# Altium schematic symbol library jlcpcb_2025_04_capacitors_extended_0805.schlib: 3281 symbols (part 11 of 18)
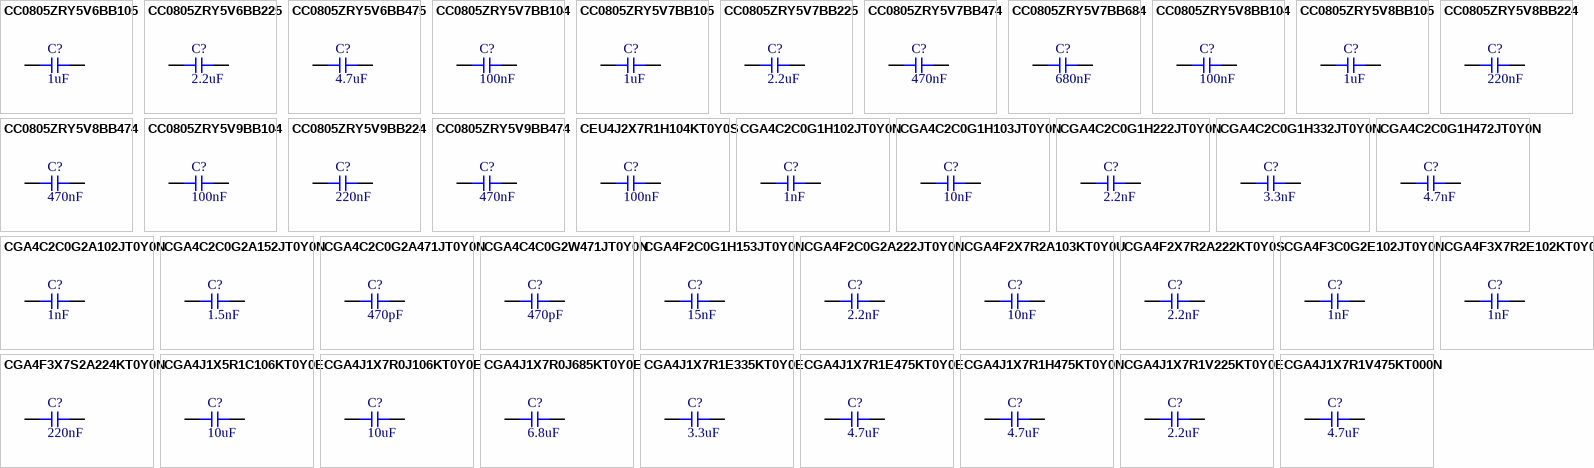
[diagram p92: symbols CC0805ZRY5V6BB105 to CGA4J1X7R1V475KT000N]

## CC0805ZRY5V8BB224
designator C?  Capacitance: 220nF  (hidden comment: *)
Capacitor, Ceramic (MLCC), 220nF, 25V, Y5V, SMD 0805; Manufacturer: YAGEO; Manufacturer Part Number: CC0805ZRY5V8BB224; Temperature Rating: -20%~+80%; Package Size: 0805; JLCPCB Basic Part: No; JLCPCB Part Number: C327192; Supplier 1: LCSC; Category: Capacitors - MLCC; Supplier Part Number 1: C327192; Voltage Rating: 25V; Temperature Coefficient: Y5V; RoHS: Yes; ComponentLink1Description: Datasheet; ComponentLink1URL: https://wmsc.lcsc.com/wmsc/upload/file/pdf/v2/lcsc/2006121004_YAGEO-CC0805ZRY5V8BB224_C327192.pdf; ComponentLink2Description: JLCPCB Part URL; ComponentLink2URL: https://jlcpcb.com/partdetail/C327192; ComponentLink3Description: LCSC Part URL; ComponentLink3URL: https://lcsc.com/product-detail/Multilayer-Ceramic-Capacitors-MLCC---SMD-SMT_YAGEO-YAGEO-CC0805ZRY5V8BB224_C327192.html
footprint CAP-0805 (0805 (2012M) Capacitor)
pins: 1, 2

## CC0805ZRY5V8BB474
designator C?  Capacitance: 470nF  (hidden comment: *)
Capacitor, Ceramic (MLCC), 470nF, 25V, Y5V, SMD 0805; Manufacturer: YAGEO; Manufacturer Part Number: CC0805ZRY5V8BB474; Temperature Rating: -20%~+80%; Package Size: 0805; JLCPCB Basic Part: No; JLCPCB Part Number: C327161; Supplier 1: LCSC; Category: Capacitors - MLCC; Supplier Part Number 1: C327161; Voltage Rating: 25V; Temperature Coefficient: Y5V; RoHS: Yes; ComponentLink1Description: Datasheet; ComponentLink1URL: https://wmsc.lcsc.com/wmsc/upload/file/pdf/v2/lcsc/1811141225_YAGEO-CC0805ZRY5V8BB474_C327161.pdf; ComponentLink2Description: JLCPCB Part URL; ComponentLink2URL: https://jlcpcb.com/partdetail/C327161; ComponentLink3Description: LCSC Part URL; ComponentLink3URL: https://lcsc.com/product-detail/Multilayer-Ceramic-Capacitors-MLCC---SMD-SMT_YAGEO-YAGEO-CC0805ZRY5V8BB474_C327161.html
footprint CAP-0805 (0805 (2012M) Capacitor)
pins: 1, 2

## CC0805ZRY5V9BB104
designator C?  Capacitance: 100nF  (hidden comment: *)
Capacitor, Ceramic (MLCC), 100nF, 50V, Y5V, SMD 0805; Manufacturer: YAGEO; Manufacturer Part Number: CC0805ZRY5V9BB104; Temperature Rating: -20%~+80%; Package Size: 0805; JLCPCB Basic Part: No; JLCPCB Part Number: C111496; Supplier 1: LCSC; Category: Capacitors - MLCC; Supplier Part Number 1: C111496; Voltage Rating: 50V; Temperature Coefficient: Y5V; RoHS: Yes; ComponentLink1Description: Datasheet; ComponentLink1URL: https://wmsc.lcsc.com/wmsc/upload/file/pdf/v2/lcsc/1811061415_YAGEO-CC0805ZRY5V9BB104_C111496.pdf; ComponentLink2Description: JLCPCB Part URL; ComponentLink2URL: https://jlcpcb.com/partdetail/C111496; ComponentLink3Description: LCSC Part URL; ComponentLink3URL: https://lcsc.com/product-detail/Multilayer-Ceramic-Capacitors-MLCC---SMD-SMT_YAGEO-YAGEO-CC0805ZRY5V9BB104_C111496.html
footprint CAP-0805 (0805 (2012M) Capacitor)
pins: 1, 2

## CC0805ZRY5V9BB224
designator C?  Capacitance: 220nF  (hidden comment: *)
Capacitor, Ceramic (MLCC), 220nF, 50V, Y5V, SMD 0805; Manufacturer: YAGEO; Manufacturer Part Number: CC0805ZRY5V9BB224; Temperature Rating: -20%~+80%; Package Size: 0805; JLCPCB Basic Part: No; JLCPCB Part Number: C326805; Supplier 1: LCSC; Category: Capacitors - MLCC; Supplier Part Number 1: C326805; Voltage Rating: 50V; Temperature Coefficient: Y5V; RoHS: Yes; ComponentLink1Description: Datasheet; ComponentLink1URL: https://wmsc.lcsc.com/wmsc/upload/file/pdf/v2/lcsc/1811141233_YAGEO-CC0805ZRY5V9BB224_C326805.pdf; ComponentLink2Description: JLCPCB Part URL; ComponentLink2URL: https://jlcpcb.com/partdetail/C326805; ComponentLink3Description: LCSC Part URL; ComponentLink3URL: https://lcsc.com/product-detail/Multilayer-Ceramic-Capacitors-MLCC---SMD-SMT_YAGEO-YAGEO-CC0805ZRY5V9BB224_C326805.html
footprint CAP-0805 (0805 (2012M) Capacitor)
pins: 1, 2

## CC0805ZRY5V9BB474
designator C?  Capacitance: 470nF  (hidden comment: *)
Capacitor, Ceramic (MLCC), 470nF, 50V, Y5V, SMD 0805; Manufacturer: YAGEO; Manufacturer Part Number: CC0805ZRY5V9BB474; Temperature Rating: -20%~+80%; Package Size: 0805; JLCPCB Basic Part: No; JLCPCB Part Number: C327107; Supplier 1: LCSC; Category: Capacitors - MLCC; Supplier Part Number 1: C327107; Voltage Rating: 50V; Temperature Coefficient: Y5V; RoHS: Yes; ComponentLink1Description: Datasheet; ComponentLink1URL: https://wmsc.lcsc.com/wmsc/upload/file/pdf/v2/lcsc/1811141233_YAGEO-CC0805ZRY5V9BB474_C327107.pdf; ComponentLink2Description: JLCPCB Part URL; ComponentLink2URL: https://jlcpcb.com/partdetail/C327107; ComponentLink3Description: LCSC Part URL; ComponentLink3URL: https://lcsc.com/product-detail/Multilayer-Ceramic-Capacitors-MLCC---SMD-SMT_YAGEO-YAGEO-CC0805ZRY5V9BB474_C327107.html
footprint CAP-0805 (0805 (2012M) Capacitor)
pins: 1, 2

## CEU4J2X7R1H104KT0Y0S
designator C?  Capacitance: 100nF  (hidden comment: *)
Capacitor, Ceramic (MLCC), 100nF, ±10%, 50V, X7R, ±10%, SMD 0805; Manufacturer: TDK; Manufacturer Part Number: CEU4J2X7R1H104KT0Y0S; Package Size: 0805; JLCPCB Basic Part: No; JLCPCB Part Number: C695378; Supplier 1: LCSC; Category: Capacitors - MLCC; Supplier Part Number 1: C695378; Tolerance: ±10%; Voltage Rating: 50V; Temperature Coefficient: X7R; RoHS: Yes; ComponentLink1Description: Datasheet; ComponentLink1URL: https://wmsc.lcsc.com/wmsc/upload/file/pdf/v2/lcsc/2009151538_TDK-CEU4J2X7R1H104KT0Y0S_C695378.pdf; ComponentLink2Description: JLCPCB Part URL; ComponentLink2URL: https://jlcpcb.com/partdetail/C695378; ComponentLink3Description: LCSC Part URL; ComponentLink3URL: https://lcsc.com/product-detail/Multilayer-Ceramic-Capacitors-MLCC---SMD-SMT_TDK-TDK-CEU4J2X7R1H104KT0Y0S_C695378.html
footprint CAP-0805 (0805 (2012M) Capacitor)
pins: 1, 2

## CGA4C2C0G1H102JT0Y0N
designator C?  Capacitance: 1nF  (hidden comment: *)
Capacitor, Ceramic (MLCC), 1nF, ±5%, 50V, C0G, ±5%, SMD 0805; Manufacturer: TDK; Manufacturer Part Number: CGA4C2C0G1H102JT0Y0N; Package Size: 0805; JLCPCB Basic Part: No; JLCPCB Part Number: C165822; Supplier 1: LCSC; Category: Capacitors - MLCC; Supplier Part Number 1: C165822; Tolerance: ±5%; Voltage Rating: 50V; Temperature Coefficient: C0G; RoHS: Yes; ComponentLink1Description: Datasheet; ComponentLink1URL: https://wmsc.lcsc.com/wmsc/upload/file/pdf/v2/lcsc/2304140030_TDK-CGA4C2C0G1H102JT0Y0N_C165822.pdf; ComponentLink2Description: JLCPCB Part URL; ComponentLink2URL: https://jlcpcb.com/partdetail/C165822; ComponentLink3Description: LCSC Part URL; ComponentLink3URL: https://lcsc.com/product-detail/Multilayer-Ceramic-Capacitors-MLCC---SMD-SMT_TDK-TDK-CGA4C2C0G1H102JT0Y0N_C165822.html
footprint CAP-0805 (0805 (2012M) Capacitor)
pins: 1, 2

## CGA4C2C0G1H103JT0Y0N
designator C?  Capacitance: 10nF  (hidden comment: *)
Capacitor, Ceramic (MLCC), 10nF, ±5%, 50V, C0G, ±5%, SMD 0805; Manufacturer: TDK; Manufacturer Part Number: CGA4C2C0G1H103JT0Y0N; Package Size: 0805; JLCPCB Basic Part: No; JLCPCB Part Number: C342877; Supplier 1: LCSC; Category: Capacitors - MLCC; Supplier Part Number 1: C342877; Tolerance: ±5%; Voltage Rating: 50V; Temperature Coefficient: C0G; RoHS: Yes; ComponentLink1Description: Datasheet; ComponentLink1URL: https://wmsc.lcsc.com/wmsc/upload/file/pdf/v2/lcsc/2304140030_TDK-CGA4C2C0G1H103JT0Y0N_C342877.pdf; ComponentLink2Description: JLCPCB Part URL; ComponentLink2URL: https://jlcpcb.com/partdetail/C342877; ComponentLink3Description: LCSC Part URL; ComponentLink3URL: https://lcsc.com/product-detail/Multilayer-Ceramic-Capacitors-MLCC---SMD-SMT_TDK-TDK-CGA4C2C0G1H103JT0Y0N_C342877.html
footprint CAP-0805 (0805 (2012M) Capacitor)
pins: 1, 2

## CGA4C2C0G1H222JT0Y0N
designator C?  Capacitance: 2.2nF  (hidden comment: *)
Capacitor, Ceramic (MLCC), 2.2nF, ±5%, 50V, C0G, ±5%, SMD 0805; Manufacturer: TDK; Manufacturer Part Number: CGA4C2C0G1H222JT0Y0N; Package Size: 0805; JLCPCB Basic Part: No; JLCPCB Part Number: C338118; Supplier 1: LCSC; Category: Capacitors - MLCC; Supplier Part Number 1: C338118; Tolerance: ±5%; Voltage Rating: 50V; Temperature Coefficient: C0G; RoHS: Yes; ComponentLink1Description: Datasheet; ComponentLink1URL: https://wmsc.lcsc.com/wmsc/upload/file/pdf/v2/lcsc/2304140030_TDK-CGA4C2C0G1H222JT0Y0N_C338118.pdf; ComponentLink2Description: JLCPCB Part URL; ComponentLink2URL: https://jlcpcb.com/partdetail/C338118; ComponentLink3Description: LCSC Part URL; ComponentLink3URL: https://lcsc.com/product-detail/Multilayer-Ceramic-Capacitors-MLCC---SMD-SMT_TDK-TDK-CGA4C2C0G1H222JT0Y0N_C338118.html
footprint CAP-0805 (0805 (2012M) Capacitor)
pins: 1, 2

## CGA4C2C0G1H332JT0Y0N
designator C?  Capacitance: 3.3nF  (hidden comment: *)
Capacitor, Ceramic (MLCC), 3.3nF, ±5%, 50V, C0G, ±5%, SMD 0805; Manufacturer: TDK; Manufacturer Part Number: CGA4C2C0G1H332JT0Y0N; Package Size: 0805; JLCPCB Basic Part: No; JLCPCB Part Number: C415302; Supplier 1: LCSC; Category: Capacitors - MLCC; Supplier Part Number 1: C415302; Tolerance: ±5%; Voltage Rating: 50V; Temperature Coefficient: C0G; RoHS: Yes; ComponentLink1Description: Datasheet; ComponentLink1URL: https://wmsc.lcsc.com/wmsc/upload/file/pdf/v2/lcsc/2304140030_TDK-CGA4C2C0G1H332JT0Y0N_C415302.pdf; ComponentLink2Description: JLCPCB Part URL; ComponentLink2URL: https://jlcpcb.com/partdetail/C415302; ComponentLink3Description: LCSC Part URL; ComponentLink3URL: https://lcsc.com/product-detail/Multilayer-Ceramic-Capacitors-MLCC---SMD-SMT_TDK-TDK-CGA4C2C0G1H332JT0Y0N_C415302.html
footprint CAP-0805 (0805 (2012M) Capacitor)
pins: 1, 2

## CGA4C2C0G1H472JT0Y0N
designator C?  Capacitance: 4.7nF  (hidden comment: *)
Capacitor, Ceramic (MLCC), 4.7nF, ±5%, 50V, C0G, ±5%, SMD 0805; Manufacturer: TDK; Manufacturer Part Number: CGA4C2C0G1H472JT0Y0N; Package Size: 0805; JLCPCB Basic Part: No; JLCPCB Part Number: C338091; Supplier 1: LCSC; Category: Capacitors - MLCC; Supplier Part Number 1: C338091; Tolerance: ±5%; Voltage Rating: 50V; Temperature Coefficient: C0G; RoHS: Yes; ComponentLink1Description: Datasheet; ComponentLink1URL: https://wmsc.lcsc.com/wmsc/upload/file/pdf/v2/lcsc/2304140030_TDK-CGA4C2C0G1H472JT0Y0N_C338091.pdf; ComponentLink2Description: JLCPCB Part URL; ComponentLink2URL: https://jlcpcb.com/partdetail/C338091; ComponentLink3Description: LCSC Part URL; ComponentLink3URL: https://lcsc.com/product-detail/Multilayer-Ceramic-Capacitors-MLCC---SMD-SMT_TDK-TDK-CGA4C2C0G1H472JT0Y0N_C338091.html
footprint CAP-0805 (0805 (2012M) Capacitor)
pins: 1, 2

## CGA4C2C0G2A102JT0Y0N
designator C?  Capacitance: 1nF  (hidden comment: *)
Capacitor, Ceramic (MLCC), 1nF, ±5%, 100V, C0G, ±5%, SMD 0805; Manufacturer: TDK; Manufacturer Part Number: CGA4C2C0G2A102JT0Y0N; Package Size: 0805; JLCPCB Basic Part: No; JLCPCB Part Number: C342977; Supplier 1: LCSC; Category: Capacitors - MLCC; Supplier Part Number 1: C342977; Tolerance: ±5%; Voltage Rating: 100V; Temperature Coefficient: C0G; RoHS: Yes; ComponentLink1Description: Datasheet; ComponentLink1URL: https://wmsc.lcsc.com/wmsc/upload/file/pdf/v2/lcsc/2304140030_TDK-CGA4C2C0G2A102JT0Y0N_C342977.pdf; ComponentLink2Description: JLCPCB Part URL; ComponentLink2URL: https://jlcpcb.com/partdetail/C342977; ComponentLink3Description: LCSC Part URL; ComponentLink3URL: https://lcsc.com/product-detail/Multilayer-Ceramic-Capacitors-MLCC---SMD-SMT_TDK-TDK-CGA4C2C0G2A102JT0Y0N_C342977.html
footprint CAP-0805 (0805 (2012M) Capacitor)
pins: 1, 2

## CGA4C2C0G2A152JT0Y0N
designator C?  Capacitance: 1.5nF  (hidden comment: *)
Capacitor, Ceramic (MLCC), 1.5nF, ±5%, 100V, C0G, ±5%, SMD 0805; Manufacturer: TDK; Manufacturer Part Number: CGA4C2C0G2A152JT0Y0N; Package Size: 0805; JLCPCB Basic Part: No; JLCPCB Part Number: C338059; Supplier 1: LCSC; Category: Capacitors - MLCC; Supplier Part Number 1: C338059; Tolerance: ±5%; Voltage Rating: 100V; Temperature Coefficient: C0G; RoHS: Yes; ComponentLink1Description: Datasheet; ComponentLink1URL: https://wmsc.lcsc.com/wmsc/upload/file/pdf/v2/lcsc/2304140030_TDK-CGA4C2C0G2A152JT0Y0N_C338059.pdf; ComponentLink2Description: JLCPCB Part URL; ComponentLink2URL: https://jlcpcb.com/partdetail/C338059; ComponentLink3Description: LCSC Part URL; ComponentLink3URL: https://lcsc.com/product-detail/Multilayer-Ceramic-Capacitors-MLCC---SMD-SMT_TDK-TDK-CGA4C2C0G2A152JT0Y0N_C338059.html
footprint CAP-0805 (0805 (2012M) Capacitor)
pins: 1, 2

## CGA4C2C0G2A471JT0Y0N
designator C?  Capacitance: 470pF  (hidden comment: *)
Capacitor, Ceramic (MLCC), 470pF, ±5%, 100V, C0G, ±5%, SMD 0805; Manufacturer: TDK; Manufacturer Part Number: CGA4C2C0G2A471JT0Y0N; Package Size: 0805; JLCPCB Basic Part: No; JLCPCB Part Number: C694228; Supplier 1: LCSC; Category: Capacitors - MLCC; Supplier Part Number 1: C694228; Tolerance: ±5%; Voltage Rating: 100V; Temperature Coefficient: C0G; RoHS: Yes; ComponentLink1Description: Datasheet; ComponentLink1URL: https://wmsc.lcsc.com/wmsc/upload/file/pdf/v2/lcsc/2304140030_TDK-CGA4C2C0G2A471JT0Y0N_C694228.pdf; ComponentLink2Description: JLCPCB Part URL; ComponentLink2URL: https://jlcpcb.com/partdetail/C694228; ComponentLink3Description: LCSC Part URL; ComponentLink3URL: https://lcsc.com/product-detail/Multilayer-Ceramic-Capacitors-MLCC---SMD-SMT_TDK-TDK-CGA4C2C0G2A471JT0Y0N_C694228.html
footprint CAP-0805 (0805 (2012M) Capacitor)
pins: 1, 2

## CGA4C4C0G2W471JT0Y0N
designator C?  Capacitance: 470pF  (hidden comment: *)
Capacitor, Ceramic (MLCC), 470pF, ±5%, 450V, C0G, ±5%, SMD 0805; Manufacturer: TDK; Manufacturer Part Number: CGA4C4C0G2W471JT0Y0N; Package Size: 0805; JLCPCB Basic Part: No; JLCPCB Part Number: C694507; Supplier 1: LCSC; Category: Capacitors - MLCC; Supplier Part Number 1: C694507; Tolerance: ±5%; Voltage Rating: 450V; Temperature Coefficient: C0G; RoHS: Yes; ComponentLink1Description: Datasheet; ComponentLink1URL: https://wmsc.lcsc.com/wmsc/upload/file/pdf/v2/lcsc/2304140030_TDK-CGA4C4C0G2W471JT0Y0N_C694507.pdf; ComponentLink2Description: JLCPCB Part URL; ComponentLink2URL: https://jlcpcb.com/partdetail/C694507; ComponentLink3Description: LCSC Part URL; ComponentLink3URL: https://lcsc.com/product-detail/Multilayer-Ceramic-Capacitors-MLCC---SMD-SMT_TDK-TDK-CGA4C4C0G2W471JT0Y0N_C694507.html
footprint CAP-0805 (0805 (2012M) Capacitor)
pins: 1, 2

## CGA4F2C0G1H153JT0Y0N
designator C?  Capacitance: 15nF  (hidden comment: *)
Capacitor, Ceramic (MLCC), 15nF, ±5%, 50V, C0G, ±5%, SMD 0805; Manufacturer: TDK; Manufacturer Part Number: CGA4F2C0G1H153JT0Y0N; Package Size: 0805; JLCPCB Basic Part: No; JLCPCB Part Number: C384557; Supplier 1: LCSC; Category: Capacitors - MLCC; Supplier Part Number 1: C384557; Tolerance: ±5%; Voltage Rating: 50V; Temperature Coefficient: C0G; RoHS: Yes; ComponentLink1Description: Datasheet; ComponentLink2Description: JLCPCB Part URL; ComponentLink2URL: https://jlcpcb.com/partdetail/C384557; ComponentLink3Description: LCSC Part URL; ComponentLink3URL: https://lcsc.com/product-detail/Multilayer-Ceramic-Capacitors-MLCC---SMD-SMT_TDK-TDK-CGA4F2C0G1H153JT0Y0N_C384557.html
footprint CAP-0805 (0805 (2012M) Capacitor)
pins: 1, 2

## CGA4F2C0G2A222JT0Y0N
designator C?  Capacitance: 2.2nF  (hidden comment: *)
Capacitor, Ceramic (MLCC), 2.2nF, ±5%, 100V, C0G, ±5%, SMD 0805; Manufacturer: TDK; Manufacturer Part Number: CGA4F2C0G2A222JT0Y0N; Package Size: 0805; JLCPCB Basic Part: No; JLCPCB Part Number: C694508; Supplier 1: LCSC; Category: Capacitors - MLCC; Supplier Part Number 1: C694508; Tolerance: ±5%; Voltage Rating: 100V; Temperature Coefficient: C0G; RoHS: Yes; ComponentLink1Description: Datasheet; ComponentLink1URL: https://wmsc.lcsc.com/wmsc/upload/file/pdf/v2/lcsc/2304140030_TDK-CGA4F2C0G2A222JT0Y0N_C694508.pdf; ComponentLink2Description: JLCPCB Part URL; ComponentLink2URL: https://jlcpcb.com/partdetail/C694508; ComponentLink3Description: LCSC Part URL; ComponentLink3URL: https://lcsc.com/product-detail/Multilayer-Ceramic-Capacitors-MLCC---SMD-SMT_TDK-TDK-CGA4F2C0G2A222JT0Y0N_C694508.html
footprint CAP-0805 (0805 (2012M) Capacitor)
pins: 1, 2

## CGA4F2X7R2A103KT0Y0U
designator C?  Capacitance: 10nF  (hidden comment: *)
Capacitor, Ceramic (MLCC), 10nF, ±10%, 100V, X7R, ±10%, SMD 0805; Manufacturer: TDK; Manufacturer Part Number: CGA4F2X7R2A103KT0Y0U; Package Size: 0805; JLCPCB Basic Part: No; JLCPCB Part Number: C338048; Supplier 1: LCSC; Category: Capacitors - MLCC; Supplier Part Number 1: C338048; Tolerance: ±10%; Voltage Rating: 100V; Temperature Coefficient: X7R; RoHS: Yes; ComponentLink1Description: Datasheet; ComponentLink1URL: https://wmsc.lcsc.com/wmsc/upload/file/pdf/v2/lcsc/2304140030_TDK-CGA4F2X7R2A103KT0Y0U_C338048.pdf; ComponentLink2Description: JLCPCB Part URL; ComponentLink2URL: https://jlcpcb.com/partdetail/C338048; ComponentLink3Description: LCSC Part URL; ComponentLink3URL: https://lcsc.com/product-detail/Multilayer-Ceramic-Capacitors-MLCC---SMD-SMT_TDK-TDK-CGA4F2X7R2A103KT0Y0U_C338048.html
footprint CAP-0805 (0805 (2012M) Capacitor)
pins: 1, 2

## CGA4F2X7R2A222KT0Y0S
designator C?  Capacitance: 2.2nF  (hidden comment: *)
Capacitor, Ceramic (MLCC), 2.2nF, ±10%, 100V, X7R, ±10%, SMD 0805; Manufacturer: TDK; Manufacturer Part Number: CGA4F2X7R2A222KT0Y0S; Package Size: 0805; JLCPCB Basic Part: No; JLCPCB Part Number: C880704; Supplier 1: LCSC; Category: Capacitors - MLCC; Supplier Part Number 1: C880704; Tolerance: ±10%; Voltage Rating: 100V; Temperature Coefficient: X7R; RoHS: Yes; ComponentLink1Description: Datasheet; ComponentLink1URL: https://wmsc.lcsc.com/wmsc/upload/file/pdf/v2/lcsc/2304140030_TDK-CGA4F2X7R2A222KT0Y0S_C880704.pdf; ComponentLink2Description: JLCPCB Part URL; ComponentLink2URL: https://jlcpcb.com/partdetail/C880704; ComponentLink3Description: LCSC Part URL; ComponentLink3URL: https://lcsc.com/product-detail/Multilayer-Ceramic-Capacitors-MLCC---SMD-SMT_TDK-TDK-CGA4F2X7R2A222KT0Y0S_C880704.html
footprint CAP-0805 (0805 (2012M) Capacitor)
pins: 1, 2

## CGA4F3C0G2E102JT0Y0N
designator C?  Capacitance: 1nF  (hidden comment: *)
Capacitor, Ceramic (MLCC), 1nF, ±5%, 250V, C0G, ±5%, SMD 0805; Manufacturer: TDK; Manufacturer Part Number: CGA4F3C0G2E102JT0Y0N; Package Size: 0805; JLCPCB Basic Part: No; JLCPCB Part Number: C338119; Supplier 1: LCSC; Category: Capacitors - MLCC; Supplier Part Number 1: C338119; Tolerance: ±5%; Voltage Rating: 250V; Temperature Coefficient: C0G; RoHS: Yes; ComponentLink1Description: Datasheet; ComponentLink1URL: https://wmsc.lcsc.com/wmsc/upload/file/pdf/v2/lcsc/2304140030_TDK-CGA4F3C0G2E102JT0Y0N_C338119.pdf; ComponentLink2Description: JLCPCB Part URL; ComponentLink2URL: https://jlcpcb.com/partdetail/C338119; ComponentLink3Description: LCSC Part URL; ComponentLink3URL: https://lcsc.com/product-detail/Multilayer-Ceramic-Capacitors-MLCC---SMD-SMT_TDK-TDK-CGA4F3C0G2E102JT0Y0N_C338119.html
footprint CAP-0805 (0805 (2012M) Capacitor)
pins: 1, 2

## CGA4F3X7R2E102KT0Y0U
designator C?  Capacitance: 1nF  (hidden comment: *)
Capacitor, Ceramic (MLCC), 1nF, 250V, X7R, SMD 0805; Manufacturer: TDK; Manufacturer Part Number: CGA4F3X7R2E102KT0Y0U; Package Size: 0805; JLCPCB Basic Part: No; JLCPCB Part Number: C2802696; Supplier 1: LCSC; Category: Capacitors - MLCC; Supplier Part Number 1: C2802696; Voltage Rating: 250V; Temperature Coefficient: X7R; RoHS: Yes; ComponentLink1Description: Datasheet; ComponentLink1URL: https://wmsc.lcsc.com/wmsc/upload/file/pdf/v2/lcsc/2106031738_TDK-CGA4F3X7R2E102KT0Y0U_C2802696.pdf; ComponentLink2Description: JLCPCB Part URL; ComponentLink2URL: https://jlcpcb.com/partdetail/C2802696; ComponentLink3Description: LCSC Part URL; ComponentLink3URL: https://lcsc.com/product-detail/Multilayer-Ceramic-Capacitors-MLCC---SMD-SMT_TDK-TDK-CGA4F3X7R2E102KT0Y0U_C2802696.html
footprint CAP-0805 (0805 (2012M) Capacitor)
pins: 1, 2

## CGA4F3X7S2A224KT0Y0N
designator C?  Capacitance: 220nF  (hidden comment: *)
Capacitor, Ceramic (MLCC), 220nF, ±10%, 100V, X7S, ±10%, SMD 0805; Manufacturer: TDK; Manufacturer Part Number: CGA4F3X7S2A224KT0Y0N; Package Size: 0805; JLCPCB Basic Part: No; JLCPCB Part Number: C338099; Supplier 1: LCSC; Category: Capacitors - MLCC; Supplier Part Number 1: C338099; Tolerance: ±10%; Voltage Rating: 100V; Temperature Coefficient: X7S; RoHS: Yes; ComponentLink1Description: Datasheet; ComponentLink1URL: https://wmsc.lcsc.com/wmsc/upload/file/pdf/v2/lcsc/2304140030_TDK-CGA4F3X7S2A224KT0Y0N_C338099.pdf; ComponentLink2Description: JLCPCB Part URL; ComponentLink2URL: https://jlcpcb.com/partdetail/C338099; ComponentLink3Description: LCSC Part URL; ComponentLink3URL: https://lcsc.com/product-detail/Multilayer-Ceramic-Capacitors-MLCC---SMD-SMT_TDK-TDK-CGA4F3X7S2A224KT0Y0N_C338099.html
footprint CAP-0805 (0805 (2012M) Capacitor)
pins: 1, 2

## CGA4J1X5R1C106KT0Y0E
designator C?  Capacitance: 10uF  (hidden comment: *)
Capacitor, Ceramic (MLCC), 10uF, ±10%, 16V, X5R, ±10%, SMD 0805; Manufacturer: TDK; Manufacturer Part Number: CGA4J1X5R1C106KT0Y0E; Package Size: 0805; JLCPCB Basic Part: No; JLCPCB Part Number: C342712; Supplier 1: LCSC; Category: Capacitors - MLCC; Supplier Part Number 1: C342712; Tolerance: ±10%; Voltage Rating: 16V; Temperature Coefficient: X5R; RoHS: Yes; ComponentLink1Description: Datasheet; ComponentLink1URL: https://wmsc.lcsc.com/wmsc/upload/file/pdf/v2/lcsc/2304140030_TDK-CGA4J1X5R1C106KT0Y0E_C342712.pdf; ComponentLink2Description: JLCPCB Part URL; ComponentLink2URL: https://jlcpcb.com/partdetail/C342712; ComponentLink3Description: LCSC Part URL; ComponentLink3URL: https://lcsc.com/product-detail/Multilayer-Ceramic-Capacitors-MLCC---SMD-SMT_TDK-TDK-CGA4J1X5R1C106KT0Y0E_C342712.html
footprint CAP-0805 (0805 (2012M) Capacitor)
pins: 1, 2

## CGA4J1X7R0J106KT0Y0E
designator C?  Capacitance: 10uF  (hidden comment: *)
Capacitor, Ceramic (MLCC), 10uF, ±10%, 6.3V, X7R, ±10%, SMD 0805; Manufacturer: TDK; Manufacturer Part Number: CGA4J1X7R0J106KT0Y0E; Package Size: 0805; JLCPCB Basic Part: No; JLCPCB Part Number: C338061; Supplier 1: LCSC; Category: Capacitors - MLCC; Supplier Part Number 1: C338061; Tolerance: ±10%; Voltage Rating: 6.3V; Temperature Coefficient: X7R; RoHS: Yes; ComponentLink1Description: Datasheet; ComponentLink1URL: https://wmsc.lcsc.com/wmsc/upload/file/pdf/v2/lcsc/2304140030_TDK-CGA4J1X7R0J106KT0Y0E_C338061.pdf; ComponentLink2Description: JLCPCB Part URL; ComponentLink2URL: https://jlcpcb.com/partdetail/C338061; ComponentLink3Description: LCSC Part URL; ComponentLink3URL: https://lcsc.com/product-detail/Multilayer-Ceramic-Capacitors-MLCC---SMD-SMT_TDK-TDK-CGA4J1X7R0J106KT0Y0E_C338061.html
footprint CAP-0805 (0805 (2012M) Capacitor)
pins: 1, 2

## CGA4J1X7R0J685KT0Y0E
designator C?  Capacitance: 6.8uF  (hidden comment: *)
Capacitor, Ceramic (MLCC), 6.8uF, 6.3V, X7R, SMD 0805; Manufacturer: TDK; Manufacturer Part Number: CGA4J1X7R0J685KT0Y0E; Package Size: 0805; JLCPCB Basic Part: No; JLCPCB Part Number: C2680661; Supplier 1: LCSC; Category: Capacitors - MLCC; Supplier Part Number 1: C2680661; Voltage Rating: 6.3V; Temperature Coefficient: X7R; RoHS: Yes; ComponentLink1Description: Datasheet; ComponentLink1URL: https://wmsc.lcsc.com/wmsc/upload/file/pdf/v2/lcsc/2101051104_TDK-CGA4J1X7R0J685KT0Y0E_C2680661.pdf; ComponentLink2Description: JLCPCB Part URL; ComponentLink2URL: https://jlcpcb.com/partdetail/C2680661; ComponentLink3Description: LCSC Part URL; ComponentLink3URL: https://lcsc.com/product-detail/Multilayer-Ceramic-Capacitors-MLCC---SMD-SMT_TDK-TDK-CGA4J1X7R0J685KT0Y0E_C2680661.html
footprint CAP-0805 (0805 (2012M) Capacitor)
pins: 1, 2

## CGA4J1X7R1E335KT0Y0E
designator C?  Capacitance: 3.3uF  (hidden comment: *)
Capacitor, Ceramic (MLCC), 3.3uF, ±10%, 25V, X7R, ±10%, SMD 0805; Manufacturer: TDK; Manufacturer Part Number: CGA4J1X7R1E335KT0Y0E; Package Size: 0805; JLCPCB Basic Part: No; JLCPCB Part Number: C409449; Supplier 1: LCSC; Category: Capacitors - MLCC; Supplier Part Number 1: C409449; Tolerance: ±10%; Voltage Rating: 25V; Temperature Coefficient: X7R; RoHS: Yes; ComponentLink1Description: Datasheet; ComponentLink1URL: https://wmsc.lcsc.com/wmsc/upload/file/pdf/v2/lcsc/2304140030_TDK-CGA4J1X7R1E335KT0Y0E_C409449.pdf; ComponentLink2Description: JLCPCB Part URL; ComponentLink2URL: https://jlcpcb.com/partdetail/C409449; ComponentLink3Description: LCSC Part URL; ComponentLink3URL: https://lcsc.com/product-detail/Multilayer-Ceramic-Capacitors-MLCC---SMD-SMT_TDK-TDK-CGA4J1X7R1E335KT0Y0E_C409449.html
footprint CAP-0805 (0805 (2012M) Capacitor)
pins: 1, 2

## CGA4J1X7R1E475KT0Y0E
designator C?  Capacitance: 4.7uF  (hidden comment: *)
Capacitor, Ceramic (MLCC), 4.7uF, ±10%, 25V, X7R, ±10%, SMD 0805; Manufacturer: TDK; Manufacturer Part Number: CGA4J1X7R1E475KT0Y0E; Package Size: 0805; JLCPCB Basic Part: No; JLCPCB Part Number: C76713; Supplier 1: LCSC; Category: Capacitors - MLCC; Supplier Part Number 1: C76713; Tolerance: ±10%; Voltage Rating: 25V; Temperature Coefficient: X7R; RoHS: Yes; ComponentLink1Description: Datasheet; ComponentLink1URL: https://wmsc.lcsc.com/wmsc/upload/file/pdf/v2/lcsc/2304140030_TDK-CGA4J1X7R1E475KT0Y0E_C76713.pdf; ComponentLink2Description: JLCPCB Part URL; ComponentLink2URL: https://jlcpcb.com/partdetail/C76713; ComponentLink3Description: LCSC Part URL; ComponentLink3URL: https://lcsc.com/product-detail/Multilayer-Ceramic-Capacitors-MLCC---SMD-SMT_TDK-TDK-CGA4J1X7R1E475KT0Y0E_C76713.html
footprint CAP-0805 (0805 (2012M) Capacitor)
pins: 1, 2

## CGA4J1X7R1H475KT0Y0N
designator C?  Capacitance: 4.7uF  (hidden comment: *)
Capacitor, Ceramic (MLCC), 4.7uF, ±10%, 50V, X7R, ±10%, SMD 0805; Manufacturer: TDK; Manufacturer Part Number: CGA4J1X7R1H475KT0Y0N; Package Size: 0805; JLCPCB Basic Part: No; JLCPCB Part Number: C694229; Supplier 1: LCSC; Category: Capacitors - MLCC; Supplier Part Number 1: C694229; Tolerance: ±10%; Voltage Rating: 50V; Temperature Coefficient: X7R; RoHS: Yes; ComponentLink1Description: Datasheet; ComponentLink1URL: https://wmsc.lcsc.com/wmsc/upload/file/pdf/v2/lcsc/2304140030_TDK-CGA4J1X7R1H475KT0Y0N_C694229.pdf; ComponentLink2Description: JLCPCB Part URL; ComponentLink2URL: https://jlcpcb.com/partdetail/C694229; ComponentLink3Description: LCSC Part URL; ComponentLink3URL: https://lcsc.com/product-detail/Multilayer-Ceramic-Capacitors-MLCC---SMD-SMT_TDK-TDK-CGA4J1X7R1H475KT0Y0N_C694229.html
footprint CAP-0805 (0805 (2012M) Capacitor)
pins: 1, 2

## CGA4J1X7R1V225KT0Y0E
designator C?  Capacitance: 2.2uF  (hidden comment: *)
Capacitor, Ceramic (MLCC), 2.2uF, ±10%, 35V, X7R, ±10%, SMD 0805; Manufacturer: TDK; Manufacturer Part Number: CGA4J1X7R1V225KT0Y0E; Package Size: 0805; JLCPCB Basic Part: No; JLCPCB Part Number: C342739; Supplier 1: LCSC; Category: Capacitors - MLCC; Supplier Part Number 1: C342739; Tolerance: ±10%; Voltage Rating: 35V; Temperature Coefficient: X7R; RoHS: Yes; ComponentLink1Description: Datasheet; ComponentLink1URL: https://wmsc.lcsc.com/wmsc/upload/file/pdf/v2/lcsc/2304140030_TDK-CGA4J1X7R1V225KT0Y0E_C342739.pdf; ComponentLink2Description: JLCPCB Part URL; ComponentLink2URL: https://jlcpcb.com/partdetail/C342739; ComponentLink3Description: LCSC Part URL; ComponentLink3URL: https://lcsc.com/product-detail/Multilayer-Ceramic-Capacitors-MLCC---SMD-SMT_TDK-TDK-CGA4J1X7R1V225KT0Y0E_C342739.html
footprint CAP-0805 (0805 (2012M) Capacitor)
pins: 1, 2

## CGA4J1X7R1V475KT000N
designator C?  Capacitance: 4.7uF  (hidden comment: *)
Capacitor, Ceramic (MLCC), 4.7uF, ±10%, 35V, X7R, ±10%, SMD 0805; Manufacturer: TDK; Manufacturer Part Number: CGA4J1X7R1V475KT000N; Package Size: 0805; JLCPCB Basic Part: No; JLCPCB Part Number: C342743; Supplier 1: LCSC; Category: Capacitors - MLCC; Supplier Part Number 1: C342743; Tolerance: ±10%; Voltage Rating: 35V; Temperature Coefficient: X7R; RoHS: Yes; ComponentLink1Description: Datasheet; ComponentLink1URL: https://wmsc.lcsc.com/wmsc/upload/file/pdf/v2/lcsc/2304140030_TDK-CGA4J1X7R1V475KT000N_C342743.pdf; ComponentLink2Description: JLCPCB Part URL; ComponentLink2URL: https://jlcpcb.com/partdetail/C342743; ComponentLink3Description: LCSC Part URL; ComponentLink3URL: https://lcsc.com/product-detail/Multilayer-Ceramic-Capacitors-MLCC---SMD-SMT_TDK-TDK-CGA4J1X7R1V475KT000N_C342743.html
footprint CAP-0805 (0805 (2012M) Capacitor)
pins: 1, 2

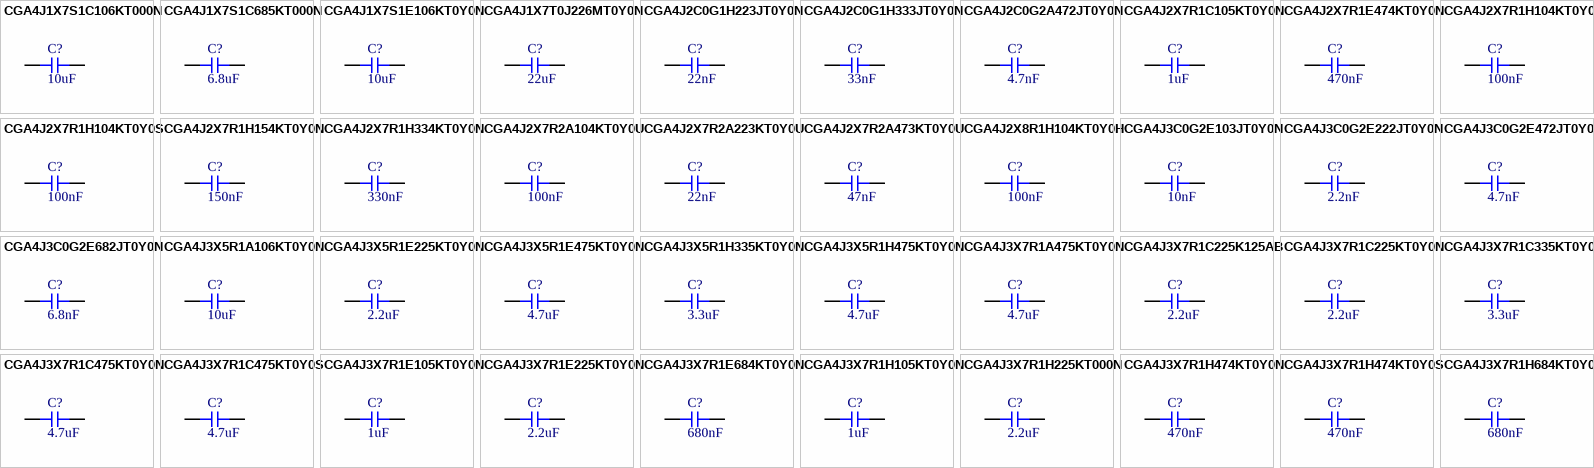
[diagram p47: symbols CGA4J1X7S1C106KT000N to CGA4J3X7R1H684KT0Y0N]

## CGA4J1X7S1C106KT000N
designator C?  Capacitance: 10uF  (hidden comment: *)
Capacitor, Ceramic (MLCC), 10uF, ±10%, 16V, X7S, ±10%, SMD 0805; Manufacturer: TDK; Manufacturer Part Number: CGA4J1X7S1C106KT000N; Package Size: 0805; JLCPCB Basic Part: No; JLCPCB Part Number: C329936; Supplier 1: LCSC; Category: Capacitors - MLCC; Supplier Part Number 1: C329936; Tolerance: ±10%; Voltage Rating: 16V; Temperature Coefficient: X7S; RoHS: Yes; ComponentLink1Description: Datasheet; ComponentLink1URL: https://wmsc.lcsc.com/wmsc/upload/file/pdf/v2/lcsc/2304140030_TDK-CGA4J1X7S1C106KT000N_C329936.pdf; ComponentLink2Description: JLCPCB Part URL; ComponentLink2URL: https://jlcpcb.com/partdetail/C329936; ComponentLink3Description: LCSC Part URL; ComponentLink3URL: https://lcsc.com/product-detail/Multilayer-Ceramic-Capacitors-MLCC---SMD-SMT_TDK-TDK-CGA4J1X7S1C106KT000N_C329936.html
footprint CAP-0805 (0805 (2012M) Capacitor)
pins: 1, 2

## CGA4J1X7S1C685KT000N
designator C?  Capacitance: 6.8uF  (hidden comment: *)
Capacitor, Ceramic (MLCC), 6.8uF, 16V, X7S, SMD 0805; Manufacturer: TDK; Manufacturer Part Number: CGA4J1X7S1C685KT000N; Package Size: 0805; JLCPCB Basic Part: No; JLCPCB Part Number: C5139488; Supplier 1: LCSC; Category: Capacitors - MLCC; Supplier Part Number 1: C5139488; Voltage Rating: 16V; Temperature Coefficient: X7S; RoHS: Yes; ComponentLink1Description: Datasheet; ComponentLink1URL: https://wmsc.lcsc.com/wmsc/upload/file/pdf/v2/lcsc/2208251730_TDK-CGA4J1X7S1C685KT000N_C5139488.pdf; ComponentLink2Description: JLCPCB Part URL; ComponentLink2URL: https://jlcpcb.com/partdetail/C5139488; ComponentLink3Description: LCSC Part URL; ComponentLink3URL: https://lcsc.com/product-detail/Multilayer-Ceramic-Capacitors-MLCC---SMD-SMT_TDK-TDK-CGA4J1X7S1C685KT000N_C5139488.html
footprint CAP-0805 (0805 (2012M) Capacitor)
pins: 1, 2

## CGA4J1X7S1E106KT0Y0N
designator C?  Capacitance: 10uF  (hidden comment: *)
Capacitor, Ceramic (MLCC), 10uF, ±10%, 25V, ±10%, SMD 0805; Manufacturer: TDK; Manufacturer Part Number: CGA4J1X7S1E106KT0Y0N; Package Size: 0805; JLCPCB Basic Part: No; JLCPCB Part Number: C694230; Supplier 1: LCSC; Category: Capacitors - MLCC; Supplier Part Number 1: C694230; Tolerance: ±10%; Voltage Rating: 25V; RoHS: Yes; ComponentLink1Description: Datasheet; ComponentLink1URL: https://wmsc.lcsc.com/wmsc/upload/file/pdf/v2/lcsc/2304140030_TDK-CGA4J1X7S1E106KT0Y0N_C694230.pdf; ComponentLink2Description: JLCPCB Part URL; ComponentLink2URL: https://jlcpcb.com/partdetail/C694230; ComponentLink3Description: LCSC Part URL; ComponentLink3URL: https://lcsc.com/product-detail/Multilayer-Ceramic-Capacitors-MLCC---SMD-SMT_TDK-TDK-CGA4J1X7S1E106KT0Y0N_C694230.html
footprint CAP-0805 (0805 (2012M) Capacitor)
pins: 1, 2

## CGA4J1X7T0J226MT0Y0N
designator C?  Capacitance: 22uF  (hidden comment: *)
Capacitor, Ceramic (MLCC), 22uF, 6.3V, X7T, SMD 0805; Manufacturer: TDK; Manufacturer Part Number: CGA4J1X7T0J226MT0Y0N; Package Size: 0805; JLCPCB Basic Part: No; JLCPCB Part Number: C5139497; Supplier 1: LCSC; Category: Capacitors - MLCC; Supplier Part Number 1: C5139497; Voltage Rating: 6.3V; Temperature Coefficient: X7T; RoHS: Yes; ComponentLink1Description: Datasheet; ComponentLink1URL: https://wmsc.lcsc.com/wmsc/upload/file/pdf/v2/lcsc/2208251730_TDK-CGA4J1X7T0J226MT0Y0N_C5139497.pdf; ComponentLink2Description: JLCPCB Part URL; ComponentLink2URL: https://jlcpcb.com/partdetail/C5139497; ComponentLink3Description: LCSC Part URL; ComponentLink3URL: https://lcsc.com/product-detail/Multilayer-Ceramic-Capacitors-MLCC---SMD-SMT_TDK-TDK-CGA4J1X7T0J226MT0Y0N_C5139497.html
footprint CAP-0805 (0805 (2012M) Capacitor)
pins: 1, 2

## CGA4J2C0G1H223JT0Y0N
designator C?  Capacitance: 22nF  (hidden comment: *)
Capacitor, Ceramic (MLCC), 22nF, ±5%, 50V, C0G, ±5%, SMD 0805; Manufacturer: TDK; Manufacturer Part Number: CGA4J2C0G1H223JT0Y0N; Package Size: 0805; JLCPCB Basic Part: No; JLCPCB Part Number: C415303; Supplier 1: LCSC; Category: Capacitors - MLCC; Supplier Part Number 1: C415303; Tolerance: ±5%; Voltage Rating: 50V; Temperature Coefficient: C0G; RoHS: Yes; ComponentLink1Description: Datasheet; ComponentLink1URL: https://wmsc.lcsc.com/wmsc/upload/file/pdf/v2/lcsc/2304140030_TDK-CGA4J2C0G1H223JT0Y0N_C415303.pdf; ComponentLink2Description: JLCPCB Part URL; ComponentLink2URL: https://jlcpcb.com/partdetail/C415303; ComponentLink3Description: LCSC Part URL; ComponentLink3URL: https://lcsc.com/product-detail/Multilayer-Ceramic-Capacitors-MLCC---SMD-SMT_TDK-TDK-CGA4J2C0G1H223JT0Y0N_C415303.html
footprint CAP-0805 (0805 (2012M) Capacitor)
pins: 1, 2

## CGA4J2C0G1H333JT0Y0N
designator C?  Capacitance: 33nF  (hidden comment: *)
Capacitor, Ceramic (MLCC), 33nF, ±5%, 50V, C0G, ±5%, SMD 0805; Manufacturer: TDK; Manufacturer Part Number: CGA4J2C0G1H333JT0Y0N; Package Size: 0805; JLCPCB Basic Part: No; JLCPCB Part Number: C342800; Supplier 1: LCSC; Category: Capacitors - MLCC; Supplier Part Number 1: C342800; Tolerance: ±5%; Voltage Rating: 50V; Temperature Coefficient: C0G; RoHS: Yes; ComponentLink1Description: Datasheet; ComponentLink1URL: https://wmsc.lcsc.com/wmsc/upload/file/pdf/v2/lcsc/2304140030_TDK-CGA4J2C0G1H333JT0Y0N_C342800.pdf; ComponentLink2Description: JLCPCB Part URL; ComponentLink2URL: https://jlcpcb.com/partdetail/C342800; ComponentLink3Description: LCSC Part URL; ComponentLink3URL: https://lcsc.com/product-detail/Multilayer-Ceramic-Capacitors-MLCC---SMD-SMT_TDK-TDK-CGA4J2C0G1H333JT0Y0N_C342800.html
footprint CAP-0805 (0805 (2012M) Capacitor)
pins: 1, 2

## CGA4J2C0G2A472JT0Y0N
designator C?  Capacitance: 4.7nF  (hidden comment: *)
Capacitor, Ceramic (MLCC), 4.7nF, ±5%, 100V, C0G, ±5%, SMD 0805; Manufacturer: TDK; Manufacturer Part Number: CGA4J2C0G2A472JT0Y0N; Package Size: 0805; JLCPCB Basic Part: No; JLCPCB Part Number: C694231; Supplier 1: LCSC; Category: Capacitors - MLCC; Supplier Part Number 1: C694231; Tolerance: ±5%; Voltage Rating: 100V; Temperature Coefficient: C0G; RoHS: Yes; ComponentLink1Description: Datasheet; ComponentLink1URL: https://wmsc.lcsc.com/wmsc/upload/file/pdf/v2/lcsc/2304140030_TDK-CGA4J2C0G2A472JT0Y0N_C694231.pdf; ComponentLink2Description: JLCPCB Part URL; ComponentLink2URL: https://jlcpcb.com/partdetail/C694231; ComponentLink3Description: LCSC Part URL; ComponentLink3URL: https://lcsc.com/product-detail/Multilayer-Ceramic-Capacitors-MLCC---SMD-SMT_TDK-TDK-CGA4J2C0G2A472JT0Y0N_C694231.html
footprint CAP-0805 (0805 (2012M) Capacitor)
pins: 1, 2

## CGA4J2X7R1C105KT0Y0N
designator C?  Capacitance: 1uF  (hidden comment: *)
Capacitor, Ceramic (MLCC), 1uF, ±10%, 16V, X7R, ±10%, SMD 0805; Manufacturer: TDK; Manufacturer Part Number: CGA4J2X7R1C105KT0Y0N; Package Size: 0805; JLCPCB Basic Part: No; JLCPCB Part Number: C338086; Supplier 1: LCSC; Category: Capacitors - MLCC; Supplier Part Number 1: C338086; Tolerance: ±10%; Voltage Rating: 16V; Temperature Coefficient: X7R; RoHS: Yes; ComponentLink1Description: Datasheet; ComponentLink1URL: https://wmsc.lcsc.com/wmsc/upload/file/pdf/v2/lcsc/2304140030_TDK-CGA4J2X7R1C105KT0Y0N_C338086.pdf; ComponentLink2Description: JLCPCB Part URL; ComponentLink2URL: https://jlcpcb.com/partdetail/C338086; ComponentLink3Description: LCSC Part URL; ComponentLink3URL: https://lcsc.com/product-detail/Multilayer-Ceramic-Capacitors-MLCC---SMD-SMT_TDK-TDK-CGA4J2X7R1C105KT0Y0N_C338086.html
footprint CAP-0805 (0805 (2012M) Capacitor)
pins: 1, 2

## CGA4J2X7R1E474KT0Y0N
designator C?  Capacitance: 470nF  (hidden comment: *)
Capacitor, Ceramic (MLCC), 470nF, ±10%, 25V, X7R, ±10%, SMD 0805; Manufacturer: TDK; Manufacturer Part Number: CGA4J2X7R1E474KT0Y0N; Package Size: 0805; JLCPCB Basic Part: No; JLCPCB Part Number: C694509; Supplier 1: LCSC; Category: Capacitors - MLCC; Supplier Part Number 1: C694509; Tolerance: ±10%; Voltage Rating: 25V; Temperature Coefficient: X7R; RoHS: Yes; ComponentLink1Description: Datasheet; ComponentLink1URL: https://wmsc.lcsc.com/wmsc/upload/file/pdf/v2/lcsc/2304140030_TDK-CGA4J2X7R1E474KT0Y0N_C694509.pdf; ComponentLink2Description: JLCPCB Part URL; ComponentLink2URL: https://jlcpcb.com/partdetail/C694509; ComponentLink3Description: LCSC Part URL; ComponentLink3URL: https://lcsc.com/product-detail/Multilayer-Ceramic-Capacitors-MLCC---SMD-SMT_TDK-TDK-CGA4J2X7R1E474KT0Y0N_C694509.html
footprint CAP-0805 (0805 (2012M) Capacitor)
pins: 1, 2

## CGA4J2X7R1H104KT0Y0N
designator C?  Capacitance: 100nF  (hidden comment: *)
Capacitor, Ceramic (MLCC), 100nF, ±10%, 50V, X7R, ±10%, SMD 0805; Manufacturer: TDK; Manufacturer Part Number: CGA4J2X7R1H104KT0Y0N; Package Size: 0805; JLCPCB Basic Part: No; JLCPCB Part Number: C415304; Supplier 1: LCSC; Category: Capacitors - MLCC; Supplier Part Number 1: C415304; Tolerance: ±10%; Voltage Rating: 50V; Temperature Coefficient: X7R; RoHS: Yes; ComponentLink1Description: Datasheet; ComponentLink1URL: https://wmsc.lcsc.com/wmsc/upload/file/pdf/v2/lcsc/2304140030_TDK-CGA4J2X7R1H104KT0Y0N_C415304.pdf; ComponentLink2Description: JLCPCB Part URL; ComponentLink2URL: https://jlcpcb.com/partdetail/C415304; ComponentLink3Description: LCSC Part URL; ComponentLink3URL: https://lcsc.com/product-detail/Multilayer-Ceramic-Capacitors-MLCC---SMD-SMT_TDK-TDK-CGA4J2X7R1H104KT0Y0N_C415304.html
footprint CAP-0805 (0805 (2012M) Capacitor)
pins: 1, 2

## CGA4J2X7R1H104KT0Y0S
designator C?  Capacitance: 100nF  (hidden comment: *)
Capacitor, Ceramic (MLCC), 100nF, ±10%, 50V, X7R, ±10%, SMD 0805; Manufacturer: TDK; Manufacturer Part Number: CGA4J2X7R1H104KT0Y0S; Package Size: 0805; JLCPCB Basic Part: No; JLCPCB Part Number: C432945; Supplier 1: LCSC; Category: Capacitors - MLCC; Supplier Part Number 1: C432945; Tolerance: ±10%; Voltage Rating: 50V; Temperature Coefficient: X7R; RoHS: Yes; ComponentLink1Description: Datasheet; ComponentLink1URL: https://wmsc.lcsc.com/wmsc/upload/file/pdf/v2/lcsc/2304140030_TDK-CGA4J2X7R1H104KT0Y0S_C432945.pdf; ComponentLink2Description: JLCPCB Part URL; ComponentLink2URL: https://jlcpcb.com/partdetail/C432945; ComponentLink3Description: LCSC Part URL; ComponentLink3URL: https://lcsc.com/product-detail/Multilayer-Ceramic-Capacitors-MLCC---SMD-SMT_TDK-TDK-CGA4J2X7R1H104KT0Y0S_C432945.html
footprint CAP-0805 (0805 (2012M) Capacitor)
pins: 1, 2

## CGA4J2X7R1H154KT0Y0N
designator C?  Capacitance: 150nF  (hidden comment: *)
Capacitor, Ceramic (MLCC), 150nF, ±10%, 50V, X7R, ±10%, SMD 0805; Manufacturer: TDK; Manufacturer Part Number: CGA4J2X7R1H154KT0Y0N; Package Size: 0805; JLCPCB Basic Part: No; JLCPCB Part Number: C338072; Supplier 1: LCSC; Category: Capacitors - MLCC; Supplier Part Number 1: C338072; Tolerance: ±10%; Voltage Rating: 50V; Temperature Coefficient: X7R; RoHS: Yes; ComponentLink1Description: Datasheet; ComponentLink1URL: https://wmsc.lcsc.com/wmsc/upload/file/pdf/v2/lcsc/2304140030_TDK-CGA4J2X7R1H154KT0Y0N_C338072.pdf; ComponentLink2Description: JLCPCB Part URL; ComponentLink2URL: https://jlcpcb.com/partdetail/C338072; ComponentLink3Description: LCSC Part URL; ComponentLink3URL: https://lcsc.com/product-detail/Multilayer-Ceramic-Capacitors-MLCC---SMD-SMT_TDK-TDK-CGA4J2X7R1H154KT0Y0N_C338072.html
footprint CAP-0805 (0805 (2012M) Capacitor)
pins: 1, 2

## CGA4J2X7R1H334KT0Y0N
designator C?  Capacitance: 330nF  (hidden comment: *)
Capacitor, Ceramic (MLCC), 330nF, ±10%, 50V, X7R, ±10%, SMD 0805; Manufacturer: TDK; Manufacturer Part Number: CGA4J2X7R1H334KT0Y0N; Package Size: 0805; JLCPCB Basic Part: No; JLCPCB Part Number: C342930; Supplier 1: LCSC; Category: Capacitors - MLCC; Supplier Part Number 1: C342930; Tolerance: ±10%; Voltage Rating: 50V; Temperature Coefficient: X7R; RoHS: Yes; ComponentLink1Description: Datasheet; ComponentLink1URL: https://wmsc.lcsc.com/wmsc/upload/file/pdf/v2/lcsc/2304140030_TDK-CGA4J2X7R1H334KT0Y0N_C342930.pdf; ComponentLink2Description: JLCPCB Part URL; ComponentLink2URL: https://jlcpcb.com/partdetail/C342930; ComponentLink3Description: LCSC Part URL; ComponentLink3URL: https://lcsc.com/product-detail/Multilayer-Ceramic-Capacitors-MLCC---SMD-SMT_TDK-TDK-CGA4J2X7R1H334KT0Y0N_C342930.html
footprint CAP-0805 (0805 (2012M) Capacitor)
pins: 1, 2
